# Altium footprint library my_lib.PcbLib: 121 footprints (part 2 of 8)
Each footprint in its own frame and in the unit in brackets; x right, y up, seen from the top. Pads: shape width x height; smd on the part's side, far side on the other; paste and mask are expansions set on the pad; w line width, h text height; cw(c..) or ccw(c..) is an arc to the next point about the centre after c.
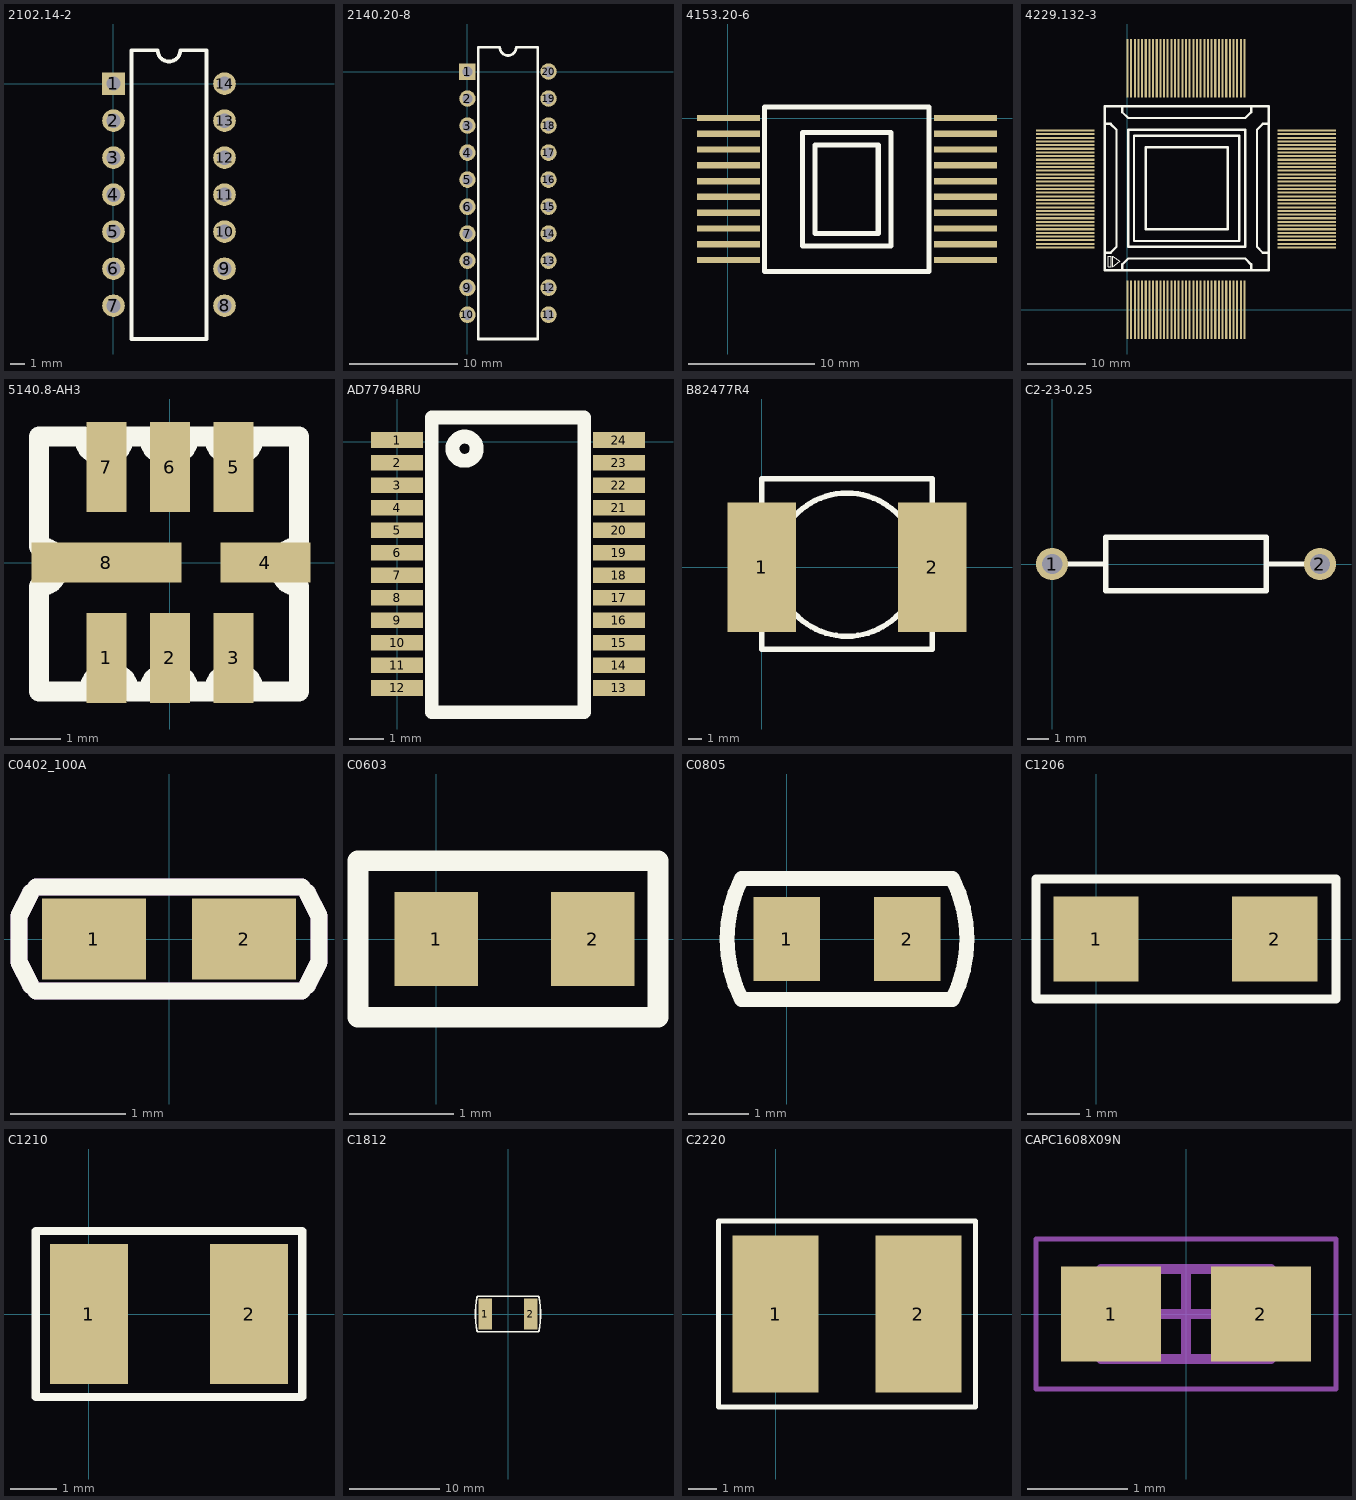
[diagram p1: the footprints below, top view; thin cyan lines are the x and y axes]

## 2102.14-2 [mil]
pads (14):
  rect 60x60 hole 38: 1(0,0)
  round 60 hole 38: 2(0,-98.43) 3(0,-196.85) 4(0,-295.28) 5(0,-393.7) 6(0,-492.13) 7(0,-590.55) 8(295.28,-590.55) 9(295.28,-492.13) 10(295.28,-393.7) 11(295.28,-295.28) 12(295.28,-196.85) 13(295.28,-98.43) 14(295.28,0)
Top Overlay:
  lines w10: 47.64,-679.13 247.64,-679.13 247.64,88.58 177.64,88.58 cw(c147.64,88.58) 117.64,88.58 47.64,88.58 47.64,-679.13

## 2140.20-8 [mil]
pads (20):
  rect 60x60 hole 38: 1(0,0)
  round 60 hole 38: 2(0,-98.43) 3(0,-196.85) 4(0,-295.28) 5(0,-393.7) 6(0,-492.13) 7(0,-590.55) 8(0,-688.98) 9(0,-787.4) 10(0,-885.83) 11(295.28,-885.83) 12(295.28,-787.4) 13(295.28,-688.98) 14(295.28,-590.55) 15(295.28,-492.13) 16(295.28,-393.7) 17(295.28,-295.28) 18(295.28,-196.85) 19(295.28,-98.43) 20(295.28,0)
Top Overlay:
  lines w10: 39.37,-974.41 39.37,88.58 117.64,88.58 ccw(c147.64,88.58) 177.64,88.58 255.91,88.58 255.91,-974.41 39.37,-974.41

## 4153.20-6 [mm]
pads (20):
  rect 5x0.5 smd: 1(0.05,0.01) 2(0.05,-1.24) 3(0.05,-2.49) 4(0.05,-3.74) 5(0.05,-4.99) 6(0.05,-6.24) 7(0.05,-7.49) 8(0.05,-8.74) 9(0.05,-9.99) 10(0.05,-11.24) 11(18.8,-11.24) 12(18.8,-9.99) 13(18.8,-8.74) 14(18.8,-7.49) 15(18.8,-6.24) 16(18.8,-4.99) 17(18.8,-3.74) 18(18.8,-2.49) 19(18.8,-1.24) 20(18.8,0.01)
Top Overlay:
  lines w0.4: 2.9,-12.14 2.9,0.86 15.9,0.86 15.9,-12.14 2.9,-12.14 ; 5.9,-10.14 5.9,-1.14 12.9,-1.14 12.9,-10.14 5.9,-10.14 ; 6.9,-9.14 6.9,-2.14 11.9,-2.14 11.9,-9.14 6.9,-9.14

## 4229.132-3 [mm]
pads (132):
  rect 0.35x10 smd: 1(0,0) 2(0.625,0) 3(1.25,0) 4(1.875,0) 5(2.5,0) 6(3.125,0) 7(3.75,0) 8(4.375,0) 9(5,0) 10(5.625,0) 11(6.25,0) 12(6.875,0) 13(7.5,0) 14(8.125,0) 15(8.75,0) 16(9.375,0) 17(10,0) 18(10.625,0) 19(11.25,0) 20(11.875,0) 21(12.5,0) 22(13.125,0) 23(13.75,0) 24(14.375,0) 25(15,0) 26(15.625,0) 27(16.25,0) 28(16.875,0) 29(17.5,0) 30(18.125,0) 31(18.75,0) 32(19.375,0) 33(20,0) 67(20,41.25) 68(19.375,41.25) 69(18.75,41.25) 70(18.125,41.25) 71(17.5,41.25) 72(16.875,41.25) 73(16.25,41.25) 74(15.625,41.25) 75(15,41.25) 76(14.375,41.25) 77(13.75,41.25) 78(13.125,41.25) 79(12.5,41.25) 80(11.875,41.25) 81(11.25,41.25) 82(10.625,41.25) 83(10,41.25) 84(9.375,41.25) 85(8.75,41.25) 86(8.125,41.25) 87(7.5,41.25) 88(6.875,41.25) 89(6.25,41.25) 90(5.625,41.25) 91(5,41.25) 92(4.375,41.25) 93(3.75,41.25) 94(3.125,41.25) 95(2.5,41.25) 96(1.875,41.25) 97(1.25,41.25) 98(0.625,41.25) 99(0,41.25)
  rect 10x0.35 smd: 34(30.625,10.625) 35(30.625,11.25) 36(30.625,11.875) 37(30.625,12.5) 38(30.625,13.125) 39(30.625,13.75) 40(30.625,14.375) 41(30.625,15) 42(30.625,15.625) 43(30.625,16.25) 44(30.625,16.875) 45(30.625,17.5) 46(30.625,18.125) 47(30.625,18.75) 48(30.625,19.375) 49(30.625,20) 50(30.625,20.625) 51(30.625,21.25) 52(30.625,21.875) 53(30.625,22.5) 54(30.625,23.125) 55(30.625,23.75) 56(30.625,24.375) 57(30.625,25) 58(30.625,25.625) 59(30.625,26.25) 60(30.625,26.875) 61(30.625,27.5) 62(30.625,28.125) 63(30.625,28.75) 64(30.625,29.375) 65(30.625,30) 66(30.625,30.625) 100(-10.625,30.625) 101(-10.625,30) 102(-10.625,29.375) 103(-10.625,28.75) 104(-10.625,28.125) 105(-10.625,27.5) 106(-10.625,26.875) 107(-10.625,26.25) 108(-10.625,25.625) 109(-10.625,25) 110(-10.625,24.375) 111(-10.625,23.75) 112(-10.625,23.125) 113(-10.625,22.5) 114(-10.625,21.875) 115(-10.625,21.25) 116(-10.625,20.625) 117(-10.625,20) 118(-10.625,19.375) 119(-10.625,18.75) 120(-10.625,18.125) 121(-10.625,17.5) 122(-10.625,16.875) 123(-10.625,16.25) 124(-10.625,15.625) 125(-10.625,15) 126(-10.625,14.375) 127(-10.625,13.75) 128(-10.625,13.125) 129(-10.625,12.5) 130(-10.625,11.875) 131(-10.625,11.25) 132(-10.625,10.625)
Top Overlay:
  lines w0.1: -3.275,7.35 -2.775,7.35 -2.775,9.15 -3.275,9.15 -3.275,7.35 ; -2.475,7.35 -1.275,8.25 -2.475,9.15 -2.475,7.35
  lines w0.4: -3.875,9.75 -2.875,9.75 -1.875,10.75 -1.875,30.75 -2.875,31.75 -3.875,31.75 ; -0.875,6.75 -0.875,7.75 0.125,8.75 20.125,8.75 21.125,7.75 21.125,6.75 ; -0.875,34.75 -0.875,33.75 0.125,32.75 20.125,32.75 21.125,33.75 21.125,34.75 ; 24.125,9.75 23.125,9.75 22.125,10.75 22.125,30.75 23.125,31.75 24.125,31.75 ; -3.875,6.75 24.125,6.75 24.125,34.75 -3.875,34.75 ; -3.875,6.75 -3.875,34.75 ; -3.875,6.75 -3.875,34.75 ; 0.125,10.75 20.125,10.75 20.125,30.75 0.125,30.75 0.125,10.75 ; 1.125,11.75 19.125,11.75 19.125,29.75 1.125,29.75 1.125,11.75 ; 3.125,13.75 17.125,13.75 17.125,27.75 3.125,27.75 3.125,13.75

## 5140.8-АН3 [mm]
pads (8):
  rect 0.8x1.8 smd: 1(-1.27,-1.905) 2(0,-1.905) 3(1.27,-1.905) 5(1.27,1.905) 6(0,1.905) 7(-1.27,1.905)
  rect 1.8x0.8 smd: 4(1.905,0)
  rect 3x0.8 smd: 8(-1.27,0)
Top Overlay:
  lines w0.4: -2.62,-2.58 -2.62,-0.48 ccw(c-2.62,-0.08) -2.62,0.32 -2.62,2.52 -1.72,2.52 ccw(c-1.32,2.52) -0.92,2.52 -0.42,2.52 ccw(c-0.02,2.52) 0.38,2.52 0.88,2.52 ccw(c1.28,2.52) 1.68,2.52 2.58,2.52 2.58,0.32 ccw(c2.58,-0.08) 2.58,-0.48 2.58,-2.58 1.68,-2.58 ccw(c1.28,-2.58) 0.88,-2.58 0.38,-2.58 ccw(c-0.02,-2.58) -0.42,-2.58 -0.82,-2.58 ccw(c-1.22,-2.58) -1.62,-2.58 -2.62,-2.58

## AD7794BRU [mm]
pads (24):
  rect 1.5x0.45 smd: 1(0,0.05) 2(0,-0.6) 3(0,-1.25) 4(0,-1.9) 5(0,-2.55) 6(0,-3.2) 7(0,-3.85) 8(0,-4.5) 9(0,-5.15) 10(0,-5.8) 11(0,-6.45) 12(0,-7.1) 13(6.4,-7.1) 14(6.4,-6.45) 15(6.4,-5.8) 16(6.4,-5.15) 17(6.4,-4.5) 18(6.4,-3.85) 19(6.4,-3.2) 20(6.4,-2.55) 21(6.4,-1.9) 22(6.4,-1.25) 23(6.4,-0.6) 24(6.4,0.05)
Top Overlay:
  lines w0.4: 1,-7.8 5.4,-7.8 5.4,0.7 1,0.7 1,-7.8 ; 1.6,-0.2 cw(c1.95,-0.2) 2.3,-0.2 cw(c1.95,-0.2) 1.6,-0.2

## B82477R4 [mm]
pads (2):
  rect 5x9.5 smd: 1(0,0) 2(12.5,0)
Top Overlay:
  lines w0.4: 0,-6 0,6.5 12.5,6.5 12.5,-6 0,-6 ; 1,0.2 cw(c6.25,0.2) 11.5,0.2 cw(c6.25,0.2) 1,0.2

## C2-23-0.25 [mil]
pads (2):
  round 60 hole 38: 1(0,0) 2(500,0)
Top Overlay:
  lines w10: 0,0 100,0 ; 400,0 500,0 ; 100,-50 400,-50 400,50 100,50 100,-50

## C0402_100A [mm]
pads (2):
  rect 0.9x0.7 smd: 1(-0.65,0) 2(0.65,0)
Top Overlay:
  lines w0.15: -1.2,-0.4 -1.3,-0.2 -1.3,0.2 -1.2,0.4 ; -1.15,-0.45 0,-0.45 1.15,-0.45 ; -1.15,0.45 0,0.45 1.15,0.45 ; 1.2,-0.4 1.3,-0.2 1.3,0.2 1.2,0.4
Mechanical 1:
  lines w0.15: -1.2,-0.4 -1.3,-0.2 -1.3,0.2 -1.2,0.4 ; -1.15,-0.45 0,-0.45 1.15,-0.45 ; -1.15,0.45 0,0.45 1.15,0.45 ; 1.2,-0.4 1.3,-0.2 1.3,0.2 1.2,0.4

## C0603 [mm]
pads (2):
  rect 0.8x0.9 smd: 1(0,0) 2(1.5,0)
Top Overlay:
  lines w0.2: -0.75,-0.75 -0.75,0.75 2.125,0.75 2.125,-0.75 -0.75,-0.75

## C0805 [mm]
pads (2):
  rect 1.1x1.4 smd: 1(0,0) 2(2,0)
Top Overlay:
  lines w0.25: -0.75,-1 2.75,-1 ; -0.75,1 2.75,1 ; -0.749,-1.001 cw(c1.25,0) -0.749,1.001 ; 2.749,-1.001 ccw(c0.75,0) 2.749,1.001

## C1206 [mil]
pads (2):
  rect 64x64 smd: 1(0,0) 2(134,0)
Top Overlay:
  lines w7: -45,-45 180,-45 180,45 -45,45 -45,-45

## C1210 [mm]
pads (2):
  rect 1.675x3 smd: 1(0,0) 2(3.429,0)
Top Overlay:
  lines w0.178: -1.143,-1.778 -1.143,1.778 4.572,1.778 4.572,-1.778 -1.143,-1.778

## C1812 [mm]
pads (2):
  rect 1.5x3.4 smd: 1(-2.5,0) 2(2.5,0)
Top Overlay:
  lines w0.2: -3.418,-1.906 cw(c6.481,0) -3.418,1.906 ; -3.4,-1.95 3.4,-1.95 ; -3.4,1.95 3.4,1.95 ; 3.418,-1.906 ccw(c-6.481,0) 3.418,1.906

## C2220 [mil]
pads (2):
  rect 120x220 smd: 1(0,0) 2(200,0)
Top Overlay:
  lines w7: -80,-130 -80,130 280,130 280,-130 -80,-130

## CAPC1608X09N [mm] "Chip Capacitor, 2-Leads, Body 1,60x0,80mm, IPC Medium Density"
height 0.9
pads (2):
  rect 1x0.95 smd: 1(-0.75,0) 2(0.75,0)
Mechanical 13:
  lines w0.1: -0.85,-0.45 0.85,-0.45 0.85,0.45 -0.85,0.45 -0.85,-0.45
Mechanical 15:
  lines w0.05: -1.5,-0.75 1.5,-0.75 1.5,0.75 -1.5,0.75 -1.5,-0.75
  lines w0.1: -0.45,0 0.45,0 ; 0,-0.45 0,0.45
3D body "CAPC1608X09N.step": height 0.9, standoff 0, extent -0.85,-0.45 0.85,0.45